# Altium footprint library sun_library.PcbLib: 412 footprints (part 16 of 26)
Each footprint in its own frame and in the unit in brackets; x right, y up, seen from the top. Pads: shape width x height; smd on the part's side, far side on the other; paste and mask are expansions set on the pad; w line width, h text height; cw(c..) or ccw(c..) is an arc to the next point about the centre after c.
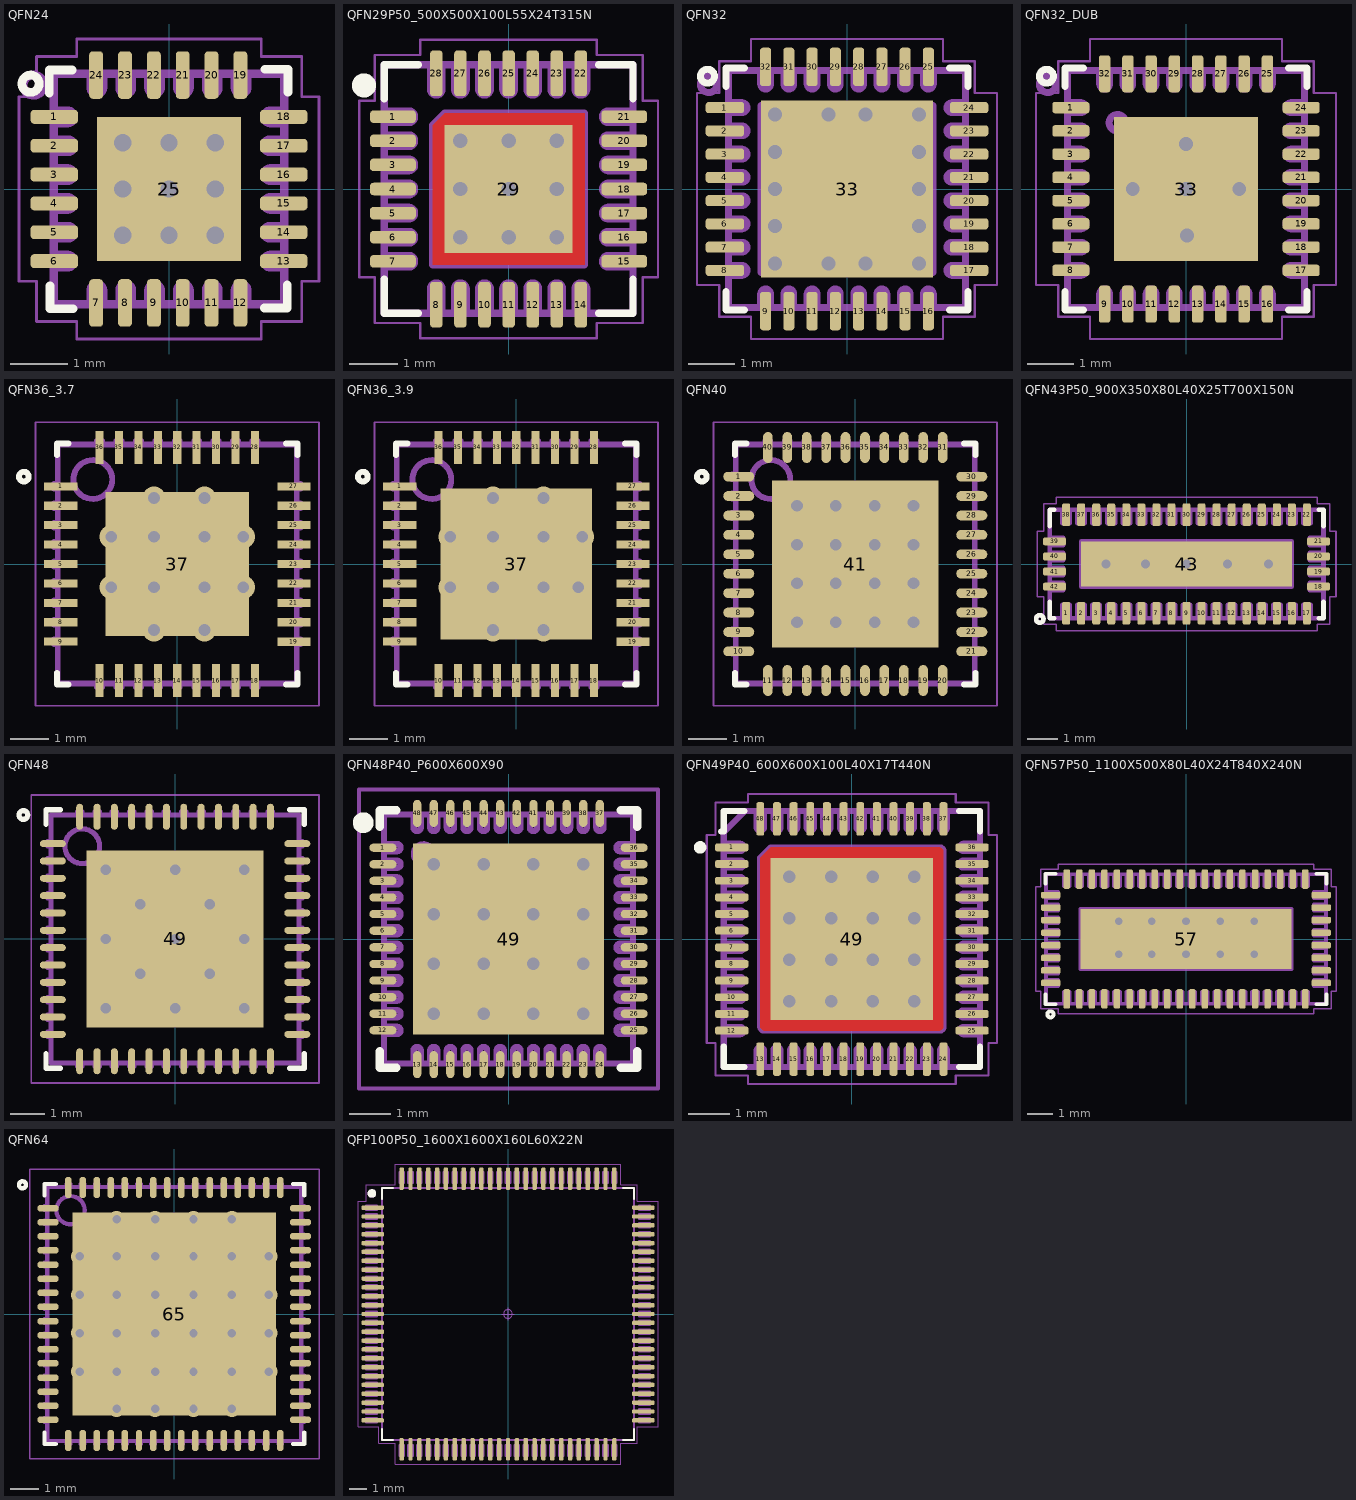
[diagram p15: the footprints below, top view; thin cyan lines are the x and y axes]

## QFN24 [mm] "Quad Flat No-Lead (QFN with Tab), 0.50 mm pitch; square, 6 pin X 6 pin, 4.00 mm L X 4.00 mm W X 0.9 mm H body"
height 0.9
pads (25):
  rrect52% 0.825x0.24 smd mask+0.05: 1(-1.987,1.25) 2(-1.987,0.75) 3(-1.987,0.25) 4(-1.987,-0.25) 5(-1.987,-0.75) 6(-1.987,-1.25) 13(1.988,-1.25) 14(1.988,-0.75) 15(1.988,-0.25) 16(1.988,0.25) 17(1.988,0.75) 18(1.988,1.25)
  rrect52% 0.24x0.825 smd mask+0.05: 7(-1.263,-1.975) 8(-0.763,-1.975) 9(-0.262,-1.975) 10(0.237,-1.975) 11(0.737,-1.975) 12(1.238,-1.975) 19(1.238,1.975) 20(0.737,1.975) 21(0.238,1.975) 22(-0.263,1.975) 23(-0.763,1.975) 24(-1.262,1.975)
  rect 2.5x2.5 smd paste-3.7 mask+0.05: 25(0,0)
via -0.8,-0.8 diameter 0.6 hole 0.3
via 0,-0.8 diameter 0.6 hole 0.3
via 0.8,-0.8 diameter 0.6 hole 0.3
via 0.8,0 diameter 0.6 hole 0.3
via -0.8,0 diameter 0.6 hole 0.3
via 0.8,0.8 diameter 0.6 hole 0.3
via 0,0 diameter 0.6 hole 0.3
via 0,0.8 diameter 0.6 hole 0.3
via -0.8,0.8 diameter 0.6 hole 0.3
Top Overlay:
  circle w0.15: c-2.4,1.825 r0.15
  lines w0.15: -2.075,1.663 -2.075,2.063 -1.675,2.063 ; -2.063,-1.675 -2.063,-2.075 -1.663,-2.075 ; 1.65,-2.063 2.05,-2.063 2.05,-1.663 ; 1.663,2.075 2.063,2.075 2.063,1.675
Top Paste:
  region: -1.037,0.25 -1.037,1.05 -0.237,1.05 -0.237,0.25
  region: 0.212,-1.05 0.212,-0.25 1.012,-0.25 1.012,-1.05
  region: 0.212,0.25 0.212,1.05 1.012,1.05 1.012,0.25
  region: -1.037,-1.05 -1.037,-0.25 -0.237,-0.25 -0.237,-1.05
TopAssy 13:
  circle w0.15: c-2.35,1.8 r0.177
  lines w0.15: -2,-2 2,-2 2,2 -2,2 -2,-2 ; -2,-1.355 -2,-1.145 -1.755,-1.145 cw(c-1.755,-1.25) -1.755,-1.355 -2,-1.355 ; -2,-0.855 -2,-0.645 -1.755,-0.645 cw(c-1.755,-0.75) -1.755,-0.855 -2,-0.855 ; -2,-0.355 -2,-0.145 -1.755,-0.145 cw(c-1.755,-0.25) -1.755,-0.355 -2,-0.355 ; -2,0.145 -2,0.355 -1.755,0.355 cw(c-1.755,0.25) -1.755,0.145 -2,0.145 ; -2,0.645 -2,0.855 -1.755,0.855 cw(c-1.755,0.75) -1.755,0.645 -2,0.645 ; -2,1.145 -2,1.355 -1.755,1.355 cw(c-1.755,1.25) -1.755,1.145 -2,1.145 ; -1.355,-2 -1.355,-1.755 cw(c-1.25,-1.755) -1.145,-1.755 -1.145,-2 -1.355,-2 ; -1.355,1.755 ccw(c-1.25,1.755) -1.145,1.755 -1.145,2 -1.355,2 -1.355,1.755 ; -0.855,-2 -0.855,-1.755 cw(c-0.75,-1.755) -0.645,-1.755 -0.645,-2 -0.855,-2 ; -0.855,1.755 ccw(c-0.75,1.755) -0.645,1.755 -0.645,2 -0.855,2 -0.855,1.755 ; -0.355,-2 -0.355,-1.755 cw(c-0.25,-1.755) -0.145,-1.755 -0.145,-2 -0.355,-2 ; -0.355,1.755 ccw(c-0.25,1.755) -0.145,1.755 -0.145,2 -0.355,2 -0.355,1.755 ; 0.145,-2 0.145,-1.755 cw(c0.25,-1.755) 0.355,-1.755 0.355,-2 0.145,-2 ; 0.145,1.755 ccw(c0.25,1.755) 0.355,1.755 0.355,2 0.145,2 0.145,1.755 ; 0.645,-2 0.645,-1.755 cw(c0.75,-1.755) 0.855,-1.755 0.855,-2 0.645,-2 ; 0.645,1.755 ccw(c0.75,1.755) 0.855,1.755 0.855,2 0.645,2 0.645,1.755 ; 1.145,-2 1.145,-1.755 cw(c1.25,-1.755) 1.355,-1.755 1.355,-2 1.145,-2 ; 1.145,1.755 ccw(c1.25,1.755) 1.355,1.755 1.355,2 1.145,2 1.145,1.755 ; 1.755,-1.355 cw(c1.755,-1.25) 1.755,-1.145 2,-1.145 2,-1.355 1.755,-1.355 ; 1.755,-0.855 cw(c1.755,-0.75) 1.755,-0.645 2,-0.645 2,-0.855 1.755,-0.855 ; 1.755,-0.355 cw(c1.755,-0.25) 1.755,-0.145 2,-0.145 2,-0.355 1.755,-0.355 ; 1.755,0.145 cw(c1.755,0.25) 1.755,0.355 2,0.355 2,0.145 1.755,0.145 ; 1.755,0.645 cw(c1.755,0.75) 1.755,0.855 2,0.855 2,0.645 1.755,0.645 ; 1.755,1.145 cw(c1.755,1.25) 1.755,1.355 2,1.355 2,1.145 1.755,1.145
CourtTop 15:
  circle w0.05: c-0.012,0 r0.25
  lines w0.05: -0.362,0 0.337,0 ; -0.012,-0.35 -0.012,0.35 ; -2.6,-1.6 -2.3,-1.6 -2.3,-2.3 -1.6,-2.3 -1.6,-2.6 1.6,-2.6 1.6,-2.3 2.3,-2.3 2.3,-1.6 2.6,-1.6 2.6,1.6 2.3,1.6 2.3,2.3 1.6,2.3 1.6,2.6 -1.6,2.6 -1.6,2.3 -2.3,2.3 -2.3,1.6 -2.6,1.6 -2.6,-1.6
3D body "User Library-QFN24.step": height 0.9, standoff 0, extent -2.017,-2.005 1.993,2.005

## QFN29P50_500X500X100L55X24T315N [mm] "Quad Flat No-Lead (QFN with Tab), 0.50 mm pitch; square, 7 pin X 7 pin, 5.00 mm L X 5.00 mm W X 1.00 mm H body"
height 1
pads (29):
  rrect54% 0.95x0.26 smd mask+0.05: 1(-2.4,1.5) 2(-2.4,1) 3(-2.4,0.5) 4(-2.4,0) 5(-2.4,-0.5) 6(-2.4,-1) 7(-2.4,-1.5) 15(2.4,-1.5) 16(2.4,-1) 17(2.4,-0.5) 18(2.4,0) 19(2.4,0.5) 20(2.4,1) 21(2.4,1.5)
  rrect54% 0.26x0.95 smd mask+0.05: 8(-1.5,-2.4) 9(-1,-2.4) 10(-0.5,-2.4) 11(0,-2.4) 12(0.5,-2.4) 13(1,-2.4) 14(1.5,-2.4) 22(1.5,2.4) 23(1,2.4) 24(0.5,2.4) 25(0,2.4) 26(-0.5,2.4) 27(-1,2.4) 28(-1.5,2.4)
  rect 2.65x2.65 smd paste-2.65 mask+0: 29(0,0)
via 0,0 diameter 0.6 hole 0.3
via -1,1 diameter 0.6 hole 0.3
via -1,0 diameter 0.6 hole 0.3
via -1,-1 diameter 0.6 hole 0.3
via 0,-1 diameter 0.6 hole 0.3
via 1,-1 diameter 0.6 hole 0.3
via 1,0 diameter 0.6 hole 0.3
via 1,1 diameter 0.6 hole 0.3
via 0,1 diameter 0.6 hole 0.3
Top:
  region: -1.575,-1.575 -1.575,1.325 -1.325,1.575 1.575,1.575 1.575,-1.575
Top Overlay:
  circle w0.25: c-3,2.15 r0.125
  lines w0.15: -2.58,-1.87 -2.58,-2.58 -1.87,-2.58 ; -2.58,1.87 -2.58,2.58 -1.87,2.58 ; 1.87,-2.58 2.58,-2.58 2.58,-1.87 ; 1.87,2.58 2.58,2.58 2.58,1.87
Top Paste:
  region: -1.265,-1.265 -1.265,-0.155 -0.155,-0.155 -0.155,-1.265
  region: 0.155,-1.265 0.155,-0.155 1.265,-0.155 1.265,-1.265
  region: -1.265,0.155 -1.265,1.265 -0.155,1.265 -0.155,0.155
  region: 0.155,0.155 0.155,1.265 1.265,1.265 1.265,0.155
Top Solder:
  region: -1.625,-1.625 -1.625,1.35 -1.35,1.625 1.625,1.625 1.625,-1.625
Bottom Solder:
  rectangle: -1.5,-1.6 1.6,1.6
TopAssy 13:
  lines w0.15: -2.58,-2.58 2.58,-2.58 2.58,2.58 -2.58,2.58 -2.58,-2.58 ; -2.5,-1.62 -2.07,-1.62 ccw(c-2.07,-1.5) -2.07,-1.38 -2.5,-1.38 -2.5,-1.62 ; -2.5,-1.12 -2.07,-1.12 ccw(c-2.07,-1) -2.07,-0.88 -2.5,-0.88 -2.5,-1.12 ; -2.5,-0.62 -2.07,-0.62 ccw(c-2.07,-0.5) -2.07,-0.38 -2.5,-0.38 -2.5,-0.62 ; -2.5,-0.12 -2.07,-0.12 ccw(c-2.07,0) -2.07,0.12 -2.5,0.12 -2.5,-0.12 ; -2.5,0.38 -2.07,0.38 ccw(c-2.07,0.5) -2.07,0.62 -2.5,0.62 -2.5,0.38 ; -2.5,0.88 -2.07,0.88 ccw(c-2.07,1) -2.07,1.12 -2.5,1.12 -2.5,0.88 ; -2.5,1.38 -2.07,1.38 ccw(c-2.07,1.5) -2.07,1.62 -2.5,1.62 -2.5,1.38 ; -1.62,-2.5 -1.62,-2.07 cw(c-1.5,-2.07) -1.38,-2.07 -1.38,-2.5 -1.62,-2.5 ; -1.62,2.07 ccw(c-1.5,2.07) -1.38,2.07 -1.38,2.5 -1.62,2.5 -1.62,2.07 ; -1.575,-1.575 -1.575,1.325 -1.325,1.575 1.575,1.575 1.575,-1.575 -1.575,-1.575 ; -1.12,-2.5 -1.12,-2.07 cw(c-1,-2.07) -0.88,-2.07 -0.88,-2.5 -1.12,-2.5 ; -1.12,2.07 ccw(c-1,2.07) -0.88,2.07 -0.88,2.5 -1.12,2.5 -1.12,2.07 ; -0.62,-2.5 -0.62,-2.07 cw(c-0.5,-2.07) -0.38,-2.07 -0.38,-2.5 -0.62,-2.5 ; -0.62,2.07 ccw(c-0.5,2.07) -0.38,2.07 -0.38,2.5 -0.62,2.5 -0.62,2.07 ; -0.12,-2.5 -0.12,-2.07 cw(c0,-2.07) 0.12,-2.07 0.12,-2.5 -0.12,-2.5 ; -0.12,2.07 ccw(c0,2.07) 0.12,2.07 0.12,2.5 -0.12,2.5 -0.12,2.07 ; 0.38,-2.5 0.38,-2.07 cw(c0.5,-2.07) 0.62,-2.07 0.62,-2.5 0.38,-2.5 ; 0.38,2.07 ccw(c0.5,2.07) 0.62,2.07 0.62,2.5 0.38,2.5 0.38,2.07 ; 0.88,-2.5 0.88,-2.07 cw(c1,-2.07) 1.12,-2.07 1.12,-2.5 0.88,-2.5 ; 0.88,2.07 ccw(c1,2.07) 1.12,2.07 1.12,2.5 0.88,2.5 0.88,2.07 ; 1.38,-2.5 1.38,-2.07 cw(c1.5,-2.07) 1.62,-2.07 1.62,-2.5 1.38,-2.5 ; 1.38,2.07 ccw(c1.5,2.07) 1.62,2.07 1.62,2.5 1.38,2.5 1.38,2.07 ; 2.07,-1.62 cw(c2.07,-1.5) 2.07,-1.38 2.5,-1.38 2.5,-1.62 2.07,-1.62 ; 2.07,-1.12 cw(c2.07,-1) 2.07,-0.88 2.5,-0.88 2.5,-1.12 2.07,-1.12 ; 2.07,-0.62 cw(c2.07,-0.5) 2.07,-0.38 2.5,-0.38 2.5,-0.62 2.07,-0.62 ; 2.07,-0.12 cw(c2.07,0) 2.07,0.12 2.5,0.12 2.5,-0.12 2.07,-0.12 ; 2.07,0.38 cw(c2.07,0.5) 2.07,0.62 2.5,0.62 2.5,0.38 2.07,0.38 ; 2.07,0.88 cw(c2.07,1) 2.07,1.12 2.5,1.12 2.5,0.88 2.07,0.88 ; 2.07,1.38 cw(c2.07,1.5) 2.07,1.62 2.5,1.62 2.5,1.38 2.07,1.38
CourtTop 15:
  circle w0.05: c0,0 r0.25
  lines w0.05: -0.35,0 0.35,0 ; 0,-0.35 0,0.35 ; -3.1,-1.83 -3.1,1.83 -2.78,1.83 -2.78,2.78 -1.83,2.78 -1.83,3.1 1.83,3.1 1.83,2.78 2.78,2.78 2.78,1.83 3.1,1.83 3.1,-1.83 2.78,-1.83 2.78,-2.78 1.83,-2.78 1.83,-3.1 -1.83,-3.1 -1.83,-2.78 -2.78,-2.78 -2.78,-1.83 -3.1,-1.83
3D body "QFN29P50_500X500X100L55X24T315.STEP": height 1, standoff 0, extent -2.55,-2.55 2.55,2.55

## QFN32 [mm] "Quad Flat No-Lead (QFN with Tab), 0.50 mm pitch; square, 8 pin X 8 pin, 5.00 mm L X 5.00 mm W X 1.00 mm H body"
height 1
pads (33):
  rrect52% 0.825x0.24 smd mask+0.05: 1(-2.625,1.75) 2(-2.625,1.25) 3(-2.625,0.75) 4(-2.625,0.25) 5(-2.625,-0.25) 6(-2.625,-0.75) 7(-2.625,-1.25) 8(-2.625,-1.75) 17(2.625,-1.75) 18(2.625,-1.25) 19(2.625,-0.75) 20(2.625,-0.25) 21(2.625,0.25) 22(2.625,0.75) 23(2.625,1.25) 24(2.625,1.75)
  rrect52% 0.24x0.825 smd mask+0.05: 9(-1.75,-2.625) 10(-1.25,-2.625) 11(-0.75,-2.625) 12(-0.25,-2.625) 13(0.25,-2.625) 14(0.75,-2.625) 15(1.25,-2.625) 16(1.75,-2.625) 25(1.75,2.625) 26(1.25,2.625) 27(0.75,2.625) 28(0.25,2.625) 29(-0.25,2.625) 30(-0.75,2.625) 31(-1.25,2.625) 32(-1.75,2.625)
  rect 3.7x3.8 smd paste-3.7 mask+0.05: 33(0,0)
via -1.55,1.6 diameter 0.6 hole 0.3
via 1.55,1.6 diameter 0.6 hole 0.3
via 0.4,1.6 diameter 0.6 hole 0.3
via -0.4,1.6 diameter 0.6 hole 0.3
via 0.4,-1.6 diameter 0.6 hole 0.3
via -0.4,-1.6 diameter 0.6 hole 0.3
via -1.55,-1.6 diameter 0.6 hole 0.3
via 1.55,0 diameter 0.6 hole 0.3
via 1.55,0.8 diameter 0.6 hole 0.3
via -1.55,0.8 diameter 0.6 hole 0.3
via -1.55,0 diameter 0.6 hole 0.3
via -1.55,-0.8 diameter 0.6 hole 0.3
via 1.55,-0.8 diameter 0.6 hole 0.3
via 1.55,-1.6 diameter 0.6 hole 0.3
Top Overlay:
  circle w0.15: c-3,2.425 r0.15
  lines w0.15: -2.6,-2.2 -2.6,-2.6 -2.2,-2.6 ; -2.6,2.2 -2.6,2.6 -2.2,2.6 ; 2.2,-2.6 2.6,-2.6 2.6,-2.2 ; 2.2,2.6 2.6,2.6 2.6,2.2
Top Paste:
  region: -1.025,-1.05 -1.025,-0.25 -0.225,-0.25 -0.225,-1.05
  region: 0.225,0.25 0.225,1.05 1.025,1.05 1.025,0.25
  region: 0.225,-1.05 0.225,-0.25 1.025,-0.25 1.025,-1.05
  region: -1.025,0.25 -1.025,1.05 -0.225,1.05 -0.225,0.25
Bottom Solder:
  rectangle: -1.9,-2 1.9,2
TopAssy 13:
  circle w0.15: c-2.975,2.25 r0.177
  circle w0.15: c-1.475,1.425 r0.177
  lines w0.15: -2.55,-2.55 -2.55,2.55 2.55,2.55 2.55,-2.55 -2.55,-2.55 ; -2.5,-1.855 -2.5,-1.645 -2.255,-1.645 cw(c-2.255,-1.75) -2.255,-1.855 -2.5,-1.855 ; -2.5,-1.355 -2.5,-1.145 -2.255,-1.145 cw(c-2.255,-1.25) -2.255,-1.355 -2.5,-1.355 ; -2.5,-0.855 -2.5,-0.645 -2.255,-0.645 cw(c-2.255,-0.75) -2.255,-0.855 -2.5,-0.855 ; -2.5,-0.355 -2.5,-0.145 -2.255,-0.145 cw(c-2.255,-0.25) -2.255,-0.355 -2.5,-0.355 ; -2.5,0.145 -2.5,0.355 -2.255,0.355 cw(c-2.255,0.25) -2.255,0.145 -2.5,0.145 ; -2.5,0.645 -2.5,0.855 -2.255,0.855 cw(c-2.255,0.75) -2.255,0.645 -2.5,0.645 ; -2.5,1.145 -2.5,1.355 -2.255,1.355 cw(c-2.255,1.25) -2.255,1.145 -2.5,1.145 ; -2.5,1.645 -2.5,1.855 -2.255,1.855 cw(c-2.255,1.75) -2.255,1.645 -2.5,1.645 ; -1.855,-2.5 -1.645,-2.5 -1.645,-2.255 ccw(c-1.75,-2.255) -1.855,-2.255 -1.855,-2.5 ; -1.855,2.255 ccw(c-1.75,2.255) -1.645,2.255 -1.645,2.5 -1.855,2.5 -1.855,2.255 ; -1.85,-1.8 1.85,-1.8 1.85,1.8 -1.85,1.8 -1.85,-1.8 ; -1.355,-2.5 -1.145,-2.5 -1.145,-2.255 ccw(c-1.25,-2.255) -1.355,-2.255 -1.355,-2.5 ; -1.355,2.255 ccw(c-1.25,2.255) -1.145,2.255 -1.145,2.5 -1.355,2.5 -1.355,2.255 ; -0.855,-2.5 -0.645,-2.5 -0.645,-2.255 ccw(c-0.75,-2.255) -0.855,-2.255 -0.855,-2.5 ; -0.855,2.255 ccw(c-0.75,2.255) -0.645,2.255 -0.645,2.5 -0.855,2.5 -0.855,2.255 ; -0.355,-2.5 -0.145,-2.5 -0.145,-2.255 ccw(c-0.25,-2.255) -0.355,-2.255 -0.355,-2.5 ; -0.355,2.255 ccw(c-0.25,2.255) -0.145,2.255 -0.145,2.5 -0.355,2.5 -0.355,2.255 ; 0.145,-2.5 0.355,-2.5 0.355,-2.255 ccw(c0.25,-2.255) 0.145,-2.255 0.145,-2.5 ; 0.145,2.255 ccw(c0.25,2.255) 0.355,2.255 0.355,2.5 0.145,2.5 0.145,2.255 ; 0.645,-2.5 0.855,-2.5 0.855,-2.255 ccw(c0.75,-2.255) 0.645,-2.255 0.645,-2.5 ; 0.645,2.255 ccw(c0.75,2.255) 0.855,2.255 0.855,2.5 0.645,2.5 0.645,2.255 ; 1.145,-2.5 1.355,-2.5 1.355,-2.255 ccw(c1.25,-2.255) 1.145,-2.255 1.145,-2.5 ; 1.145,2.255 ccw(c1.25,2.255) 1.355,2.255 1.355,2.5 1.145,2.5 1.145,2.255 ; 1.645,-2.5 1.855,-2.5 1.855,-2.255 ccw(c1.75,-2.255) 1.645,-2.255 1.645,-2.5 ; 1.645,2.255 ccw(c1.75,2.255) 1.855,2.255 1.855,2.5 1.645,2.5 1.645,2.255 ; 2.255,-1.855 cw(c2.255,-1.75) 2.255,-1.645 2.5,-1.645 2.5,-1.855 2.255,-1.855 ; 2.255,-1.355 cw(c2.255,-1.25) 2.255,-1.145 2.5,-1.145 2.5,-1.355 2.255,-1.355 ; 2.255,-0.855 cw(c2.255,-0.75) 2.255,-0.645 2.5,-0.645 2.5,-0.855 2.255,-0.855 ; 2.255,-0.355 cw(c2.255,-0.25) 2.255,-0.145 2.5,-0.145 2.5,-0.355 2.255,-0.355 ; 2.255,0.145 cw(c2.255,0.25) 2.255,0.355 2.5,0.355 2.5,0.145 2.255,0.145 ; 2.255,0.645 cw(c2.255,0.75) 2.255,0.855 2.5,0.855 2.5,0.645 2.255,0.645 ; 2.255,1.145 cw(c2.255,1.25) 2.255,1.355 2.5,1.355 2.5,1.145 2.255,1.145 ; 2.255,1.645 cw(c2.255,1.75) 2.255,1.855 2.5,1.855 2.5,1.645 2.255,1.645
CourtTop 15:
  circle w0.05: c0,0 r0.25
  lines w0.05: -0.35,0 0.35,0 ; 0,-0.35 0,0.35 ; -3.225,-2.065 -2.75,-2.065 -2.75,-2.75 -2.065,-2.75 -2.065,-3.225 2.065,-3.225 2.065,-2.75 2.75,-2.75 2.75,-2.065 3.225,-2.065 3.225,2.065 2.75,2.065 2.75,2.75 2.065,2.75 2.065,3.225 -2.065,3.225 -2.065,2.75 -2.75,2.75 -2.75,2.065 -3.225,2.065 -3.225,-2.065
3D body "QFN33P50_500X500X100L35X21T360X370.STEP": height 1, standoff 0, extent -2.55,-2.55 2.55,2.55

## QFN32_DUB [mm] "Quad Flat No-Lead (QFN with Tab), 0.50 mm pitch; square, 8 pin X 8 pin, 5.00 mm L X 5.00 mm W X 1.00 mm H body"
height 1
pads (33):
  rrect50% 0.8x0.25 smd paste+0 mask+0.075: 1(-2.475,1.75) 2(-2.475,1.25) 3(-2.475,0.75) 4(-2.475,0.25) 5(-2.475,-0.25) 6(-2.475,-0.75) 7(-2.475,-1.25) 8(-2.475,-1.75) 17(2.475,-1.75) 18(2.475,-1.25) 19(2.475,-0.75) 20(2.475,-0.25) 21(2.475,0.25) 22(2.475,0.75) 23(2.475,1.25) 24(2.475,1.75)
  rrect50% 0.25x0.8 smd paste+0 mask+0.075: 9(-1.75,-2.475) 10(-1.25,-2.475) 11(-0.75,-2.475) 12(-0.25,-2.475) 13(0.25,-2.475) 14(0.75,-2.475) 15(1.25,-2.475) 16(1.75,-2.475) 25(1.75,2.475) 26(1.25,2.475) 27(0.75,2.475) 28(0.25,2.475) 29(-0.25,2.475) 30(-0.75,2.475) 31(-1.25,2.475) 32(-1.75,2.475)
  rect 3.1x3.1 smd paste-1.537 mask+0.075: 33(0,0)
via -1.145,0 diameter 0.6 hole 0.3
via 1.145,0 diameter 0.6 hole 0.3
via 0.025,-0.996 diameter 0.6 hole 0.3
via 0,0.967 diameter 0.6 hole 0.3
via 0,0 diameter 0.6 hole 0.3
Top Overlay:
  circle w0.15: c-3,2.425 r0.15
  lines w0.15: -2.6,-2.2 -2.6,-2.6 -2.2,-2.6 ; -2.6,2.2 -2.6,2.6 -2.2,2.6 ; 2.2,-2.6 2.6,-2.6 2.6,-2.2 ; 2.2,2.6 2.6,2.6 2.6,2.2
Top Paste:
  region: -1.025,-1.05 -1.025,-0.25 -0.225,-0.25 -0.225,-1.05
  region: 0.225,0.25 0.225,1.05 1.025,1.05 1.025,0.25
  region: 0.225,-1.05 0.225,-0.25 1.025,-0.25 1.025,-1.05
  region: -1.025,0.25 -1.025,1.05 -0.225,1.05 -0.225,0.25
Bottom Solder:
  rectangle: -1.6,-1.6 1.6,1.6
TopAssy 13:
  circle w0.15: c-2.975,2.25 r0.177
  circle w0.15: c-1.475,1.425 r0.177
  lines w0.15: -2.55,-2.55 -2.55,2.55 2.55,2.55 2.55,-2.55 -2.55,-2.55 ; -2.5,-1.855 -2.5,-1.645 -2.255,-1.645 cw(c-2.255,-1.75) -2.255,-1.855 -2.5,-1.855 ; -2.5,-1.355 -2.5,-1.145 -2.255,-1.145 cw(c-2.255,-1.25) -2.255,-1.355 -2.5,-1.355 ; -2.5,-0.855 -2.5,-0.645 -2.255,-0.645 cw(c-2.255,-0.75) -2.255,-0.855 -2.5,-0.855 ; -2.5,-0.355 -2.5,-0.145 -2.255,-0.145 cw(c-2.255,-0.25) -2.255,-0.355 -2.5,-0.355 ; -2.5,0.145 -2.5,0.355 -2.255,0.355 cw(c-2.255,0.25) -2.255,0.145 -2.5,0.145 ; -2.5,0.645 -2.5,0.855 -2.255,0.855 cw(c-2.255,0.75) -2.255,0.645 -2.5,0.645 ; -2.5,1.145 -2.5,1.355 -2.255,1.355 cw(c-2.255,1.25) -2.255,1.145 -2.5,1.145 ; -2.5,1.645 -2.5,1.855 -2.255,1.855 cw(c-2.255,1.75) -2.255,1.645 -2.5,1.645 ; -1.855,-2.5 -1.645,-2.5 -1.645,-2.255 ccw(c-1.75,-2.255) -1.855,-2.255 -1.855,-2.5 ; -1.855,2.255 ccw(c-1.75,2.255) -1.645,2.255 -1.645,2.5 -1.855,2.5 -1.855,2.255 ; -1.355,-2.5 -1.145,-2.5 -1.145,-2.255 ccw(c-1.25,-2.255) -1.355,-2.255 -1.355,-2.5 ; -1.355,2.255 ccw(c-1.25,2.255) -1.145,2.255 -1.145,2.5 -1.355,2.5 -1.355,2.255 ; -0.855,-2.5 -0.645,-2.5 -0.645,-2.255 ccw(c-0.75,-2.255) -0.855,-2.255 -0.855,-2.5 ; -0.855,2.255 ccw(c-0.75,2.255) -0.645,2.255 -0.645,2.5 -0.855,2.5 -0.855,2.255 ; -0.355,-2.5 -0.145,-2.5 -0.145,-2.255 ccw(c-0.25,-2.255) -0.355,-2.255 -0.355,-2.5 ; -0.355,2.255 ccw(c-0.25,2.255) -0.145,2.255 -0.145,2.5 -0.355,2.5 -0.355,2.255 ; 0.145,-2.5 0.355,-2.5 0.355,-2.255 ccw(c0.25,-2.255) 0.145,-2.255 0.145,-2.5 ; 0.145,2.255 ccw(c0.25,2.255) 0.355,2.255 0.355,2.5 0.145,2.5 0.145,2.255 ; 0.645,-2.5 0.855,-2.5 0.855,-2.255 ccw(c0.75,-2.255) 0.645,-2.255 0.645,-2.5 ; 0.645,2.255 ccw(c0.75,2.255) 0.855,2.255 0.855,2.5 0.645,2.5 0.645,2.255 ; 1.145,-2.5 1.355,-2.5 1.355,-2.255 ccw(c1.25,-2.255) 1.145,-2.255 1.145,-2.5 ; 1.145,2.255 ccw(c1.25,2.255) 1.355,2.255 1.355,2.5 1.145,2.5 1.145,2.255 ; 1.645,-2.5 1.855,-2.5 1.855,-2.255 ccw(c1.75,-2.255) 1.645,-2.255 1.645,-2.5 ; 1.645,2.255 ccw(c1.75,2.255) 1.855,2.255 1.855,2.5 1.645,2.5 1.645,2.255 ; 2.255,-1.855 cw(c2.255,-1.75) 2.255,-1.645 2.5,-1.645 2.5,-1.855 2.255,-1.855 ; 2.255,-1.355 cw(c2.255,-1.25) 2.255,-1.145 2.5,-1.145 2.5,-1.355 2.255,-1.355 ; 2.255,-0.855 cw(c2.255,-0.75) 2.255,-0.645 2.5,-0.645 2.5,-0.855 2.255,-0.855 ; 2.255,-0.355 cw(c2.255,-0.25) 2.255,-0.145 2.5,-0.145 2.5,-0.355 2.255,-0.355 ; 2.255,0.145 cw(c2.255,0.25) 2.255,0.355 2.5,0.355 2.5,0.145 2.255,0.145 ; 2.255,0.645 cw(c2.255,0.75) 2.255,0.855 2.5,0.855 2.5,0.645 2.255,0.645 ; 2.255,1.145 cw(c2.255,1.25) 2.255,1.355 2.5,1.355 2.5,1.145 2.255,1.145 ; 2.255,1.645 cw(c2.255,1.75) 2.255,1.855 2.5,1.855 2.5,1.645 2.255,1.645
CourtTop 15:
  circle w0.05: c0,0 r0.25
  lines w0.05: -0.35,0 0.35,0 ; 0,-0.35 0,0.35 ; -3.225,-2.065 -2.75,-2.065 -2.75,-2.75 -2.065,-2.75 -2.065,-3.225 2.065,-3.225 2.065,-2.75 2.75,-2.75 2.75,-2.065 3.225,-2.065 3.225,2.065 2.75,2.065 2.75,2.75 2.065,2.75 2.065,3.225 -2.065,3.225 -2.065,2.75 -2.75,2.75 -2.75,2.065 -3.225,2.065 -3.225,-2.065
3D body "QFN33P50_500X500X100L35X21T360X370.STEP": height 1, standoff 0, extent -2.55,-2.55 2.55,2.55

## QFN36_3.7 [mm] "36-Lead thin QFN, 0.5mm Pitch, 6mm x 6mm body"
height 0.85
pads (37):
  rect 0.85x0.21 smd paste-0.15 mask+0.05: 1(-3,2) 2(-3,1.5) 3(-3,1) 4(-3,0.5) 5(-3,0) 6(-3,-0.5) 7(-3,-1) 8(-3,-1.5) 9(-3,-2) 19(3,-2) 20(3,-1.5) 21(3,-1) 22(3,-0.5) 23(3,0) 24(3,0.5) 25(3,1) 26(3,1.5) 27(3,2)
  rect 0.21x0.85 smd paste-0.15 mask+0.05: 10(-2,-3) 11(-1.5,-3) 12(-1,-3) 13(-0.5,-3) 14(0,-3) 15(0.5,-3) 16(1,-3) 17(1.5,-3) 18(2,-3) 28(2,3) 29(1.5,3) 30(1,3) 31(0.5,3) 32(0,3) 33(-0.5,3) 34(-1,3) 35(-1.5,3) 36(-2,3)
  rect 3.7x3.7 smd paste-3: 37(0,0)
via 1.7,-0.6 diameter 0.6 hole 0.3
via -0.6,-1.7 diameter 0.6 hole 0.3
via 0.7,-1.7 diameter 0.6 hole 0.3
via 0.7,-0.6 diameter 0.6 hole 0.3
via -0.6,-0.6 diameter 0.6 hole 0.3
via -1.7,-0.6 diameter 0.6 hole 0.3
via 1.7,0.7 diameter 0.6 hole 0.3
via 0.7,0.7 diameter 0.6 hole 0.3
via -0.6,0.7 diameter 0.6 hole 0.3
via -1.7,0.7 diameter 0.6 hole 0.3
via 0.7,1.7 diameter 0.6 hole 0.3
via -0.6,1.7 diameter 0.6 hole 0.3
Top Overlay:
  circle w0.15: c-3.95,2.25 r0.125
  lines w0.15: -3.1,-2.8 -3.1,-3.1 -2.8,-3.1 ; -3.1,2.8 -3.1,3.1 -2.8,3.1 ; 2.8,-3.1 3.1,-3.1 3.1,-2.8 ; 2.8,3.1 3.1,3.1 3.1,2.8
Top Paste:
  drawing of 45 lines, arcs and shapes, not listed
Bottom Solder:
  rectangle: -2.1,-2.1 2.1,2.1
TopAssy 13:
  circle w0.15: c-2.175,2.175 r0.5
  lines w0.15: -3.175,-2.063 -3.175,-1.937 ; -3.175,-1.563 -3.175,-1.438 ; -3.175,-1.063 -3.175,-0.938 ; -3.175,-0.563 -3.175,-0.438 ; -3.175,-0.063 -3.175,0.063 ; -3.175,0.437 -3.175,0.563 ; -3.175,0.937 -3.175,1.062 ; -3.175,1.437 -3.175,1.562 ; -3.175,1.937 -3.175,2.062 ; -2.062,-3.175 -1.937,-3.175 ; -2.063,3.175 -1.937,3.175 ; -1.562,-3.175 -1.437,-3.175 ; -1.563,3.175 -1.438,3.175 ; -1.062,-3.175 -0.937,-3.175 ; -1.063,3.175 -0.938,3.175 ; -0.563,-3.175 -0.437,-3.175 ; -0.563,3.175 -0.438,3.175 ; -0.063,-3.175 0.063,-3.175 ; -0.063,3.175 0.063,3.175 ; 0.438,-3.175 0.563,-3.175 ; 0.437,3.175 0.563,3.175 ; 0.938,-3.175 1.063,-3.175 ; 0.937,3.175 1.062,3.175 ; 1.438,-3.175 1.563,-3.175 ; 1.437,3.175 1.562,3.175 ; 1.937,-3.175 2.063,-3.175 ; 1.937,3.175 2.062,3.175 ; 3.175,-2.062 3.175,-1.937 ; 3.175,-1.562 3.175,-1.437 ; 3.175,-1.062 3.175,-0.937 ; 3.175,-0.563 3.175,-0.437 ; 3.175,-0.063 3.175,0.063 ; 3.175,0.438 3.175,0.563 ; 3.175,0.938 3.175,1.063 ; 3.175,1.438 3.175,1.563 ; 3.175,1.937 3.175,2.063 ; -3.075,-3.075 -3.075,3.075 3.075,3.075 3.075,-3.075 -3.075,-3.075
CourtTop 15:
  lines w0.05: -0.5,0 0.5,0 ; 0,-0.5 0,0.5 ; -3.65,-3.65 -3.65,3.65 3.65,3.65 3.65,-3.65 -3.65,-3.65
3D body "ALSRobot-QFN36 6x6.step": height 0.9, standoff 0.01, extent -3.102,-3.103 3.103,3.103
